# Altium schematic symbol library jlcpcb_2025_04_inductors_extended_0603.schlib: 1269 symbols (part 4 of 7) (continued)
## LQW18ANR13J00D
designator L?  Inductance: 130nH
Inductor, 130nH, ±5%, 1.4Ω, 170mA, SMD 0603; Manufacturer: Murata Electronics; Manufacturer Part Number: LQW18ANR13J00D; Package Size: 0603; JLCPCB Basic Part: No; JLCPCB Part Number: C701178; Supplier 1: LCSC; Category: Inductors; Supplier Part Number 1: C701178; Tolerance: ±5%; Rated Current: 170mA; DC Resistance: 1.4Ω; RoHS: Yes; ComponentLink1Description: Datasheet; ComponentLink1URL: https://wmsc.lcsc.com/wmsc/upload/file/pdf/v2/lcsc/2009291135_Murata-Electronics-LQW18ANR13J00D_C701178.pdf; ComponentLink2Description: JLCPCB Part URL; ComponentLink2URL: https://jlcpcb.com/partdetail/C701178; ComponentLink3Description: LCSC Part URL; ComponentLink3URL: https://lcsc.com/product-detail/Power-Inductors_Murata-Electronics-Murata-Electronics-LQW18ANR13J00D_C701178.html
footprint IND-0603 (0603 (1608M) Inductor)
pins: 1, 2

## LQW18ANR15G00D
designator L?  Inductance: 150nH
Inductor, 150nH, ±2%, 1.5Ω, SMD 0603; Manufacturer: Murata Electronics; Manufacturer Part Number: LQW18ANR15G00D; Self-Resonant Frequency: 1.4GHz; Q Factor: 32@150MHz; Package Size: 0603; JLCPCB Basic Part: No; JLCPCB Part Number: C113131; Supplier 1: LCSC; Category: Inductors; Supplier Part Number 1: C113131; Tolerance: ±2%; DC Resistance: 1.5Ω; RoHS: Yes; ComponentLink1Description: Datasheet; ComponentLink1URL: https://wmsc.lcsc.com/wmsc/upload/file/pdf/v2/lcsc/2304140030_Murata-Electronics-LQW18ANR15G00D_C113131.pdf; ComponentLink2Description: JLCPCB Part URL; ComponentLink2URL: https://jlcpcb.com/partdetail/C113131; ComponentLink3Description: LCSC Part URL; ComponentLink3URL: https://lcsc.com/product-detail/Inductors-SMD_Murata-Electronics-Murata-Electronics-LQW18ANR15G00D_C113131.html
footprint IND-0603 (0603 (1608M) Inductor)
pins: 1, 2

## LQW18ANR15G80D
designator L?  Inductance: 150nH
Inductor, 150nH, ±2%, 870mΩ, SMD 0603; Manufacturer: Murata Electronics; Manufacturer Part Number: LQW18ANR15G80D; Self-Resonant Frequency: 1.58GHz; Q Factor: 28@150MHz; Package Size: 0603; JLCPCB Basic Part: No; JLCPCB Part Number: C307614; Supplier 1: LCSC; Category: Inductors; Supplier Part Number 1: C307614; Tolerance: ±2%; DC Resistance: 870mΩ; RoHS: Yes; ComponentLink1Description: Datasheet; ComponentLink1URL: https://wmsc.lcsc.com/wmsc/upload/file/pdf/v2/lcsc/2304140030_Murata-Electronics-LQW18ANR15G80D_C307614.pdf; ComponentLink2Description: JLCPCB Part URL; ComponentLink2URL: https://jlcpcb.com/partdetail/C307614; ComponentLink3Description: LCSC Part URL; ComponentLink3URL: https://lcsc.com/product-detail/Inductors-SMD_Murata-Electronics-Murata-Electronics-LQW18ANR15G80D_C307614.html
footprint IND-0603 (0603 (1608M) Inductor)
pins: 1, 2

## LQW18ANR15J00D
designator L?  Inductance: 150nH
Inductor, 150nH, ±5%, 1.5Ω, 160mA, SMD 0603; Manufacturer: Murata Electronics; Manufacturer Part Number: LQW18ANR15J00D; Self-Resonant Frequency: 1.4GHz; Q Factor: 32@150MHz; Package Size: 0603; JLCPCB Basic Part: No; JLCPCB Part Number: C98090; Supplier 1: LCSC; Category: Inductors; Supplier Part Number 1: C98090; Tolerance: ±5%; Rated Current: 160mA; DC Resistance: 1.5Ω; RoHS: Yes; ComponentLink1Description: Datasheet; ComponentLink1URL: https://wmsc.lcsc.com/wmsc/upload/file/pdf/v2/lcsc/2304140030_Murata-Electronics-LQW18ANR15J00D_C98090.pdf; ComponentLink2Description: JLCPCB Part URL; ComponentLink2URL: https://jlcpcb.com/partdetail/C98090; ComponentLink3Description: LCSC Part URL; ComponentLink3URL: https://lcsc.com/product-detail/Inductors-SMD_Murata-Electronics-Murata-Electronics-LQW18ANR15J00D_C98090.html
footprint IND-0603 (0603 (1608M) Inductor)
pins: 1, 2

## LQW18ANR15J80D
designator L?  Inductance: 150nH
Inductor, 150nH, ±5%, 870mΩ, 420mA, SMD 0603; Manufacturer: Murata Electronics; Manufacturer Part Number: LQW18ANR15J80D; Package Size: 0603; JLCPCB Basic Part: No; JLCPCB Part Number: C2896795; Supplier 1: LCSC; Category: Inductors; Supplier Part Number 1: C2896795; Tolerance: ±5%; Rated Current: 420mA; DC Resistance: 870mΩ; RoHS: Yes; ComponentLink1Description: Datasheet; ComponentLink1URL: https://wmsc.lcsc.com/wmsc/upload/file/pdf/v2/lcsc/2109180930_Murata-Electronics-LQW18ANR15J80D_C2896795.pdf; ComponentLink2Description: JLCPCB Part URL; ComponentLink2URL: https://jlcpcb.com/partdetail/C2896795; ComponentLink3Description: LCSC Part URL; ComponentLink3URL: https://lcsc.com/product-detail/Power-Inductors_Murata-Electronics-Murata-Electronics-LQW18ANR15J80D_C2896795.html
footprint IND-0603 (0603 (1608M) Inductor)
pins: 1, 2

## LQW18ANR16G00D
designator L?  Inductance: 160nH
Inductor, 160nH, ±2%, 2.1Ω, 150mA, SMD 0603; Manufacturer: Murata Electronics; Manufacturer Part Number: LQW18ANR16G00D; Package Size: 0603; JLCPCB Basic Part: No; JLCPCB Part Number: C307615; Supplier 1: LCSC; Category: Inductors; Supplier Part Number 1: C307615; Tolerance: ±2%; Rated Current: 150mA; DC Resistance: 2.1Ω; RoHS: Yes; ComponentLink1Description: Datasheet; ComponentLink1URL: https://wmsc.lcsc.com/wmsc/upload/file/pdf/v2/lcsc/2304140030_Murata-Electronics-LQW18ANR16G00D_C307615.pdf; ComponentLink2Description: JLCPCB Part URL; ComponentLink2URL: https://jlcpcb.com/partdetail/C307615; ComponentLink3Description: LCSC Part URL; ComponentLink3URL: https://lcsc.com/product-detail/Power-Inductors_Murata-Electronics-Murata-Electronics-LQW18ANR16G00D_C307615.html
footprint IND-0603 (0603 (1608M) Inductor)
pins: 1, 2

## LQW18ANR16J00D
designator L?  Inductance: 160nH
Inductor, 160nH, ±5%, 2.1Ω, 150mA, SMD 0603; Manufacturer: Murata Electronics; Manufacturer Part Number: LQW18ANR16J00D; Self-Resonant Frequency: 1.35GHz; Q Factor: 32@150MHz; Package Size: 0603; JLCPCB Basic Part: No; JLCPCB Part Number: C140445; Supplier 1: LCSC; Category: Inductors; Supplier Part Number 1: C140445; Tolerance: ±5%; Rated Current: 150mA; DC Resistance: 2.1Ω; RoHS: Yes; ComponentLink1Description: Datasheet; ComponentLink1URL: https://wmsc.lcsc.com/wmsc/upload/file/pdf/v2/lcsc/2304140030_Murata-Electronics-LQW18ANR16J00D_C140445.pdf; ComponentLink2Description: JLCPCB Part URL; ComponentLink2URL: https://jlcpcb.com/partdetail/C140445; ComponentLink3Description: LCSC Part URL; ComponentLink3URL: https://lcsc.com/product-detail/Inductors-SMD_Murata-Electronics-Murata-Electronics-LQW18ANR16J00D_C140445.html
footprint IND-0603 (0603 (1608M) Inductor)
pins: 1, 2

## LQW18ANR18G00D
designator L?  Inductance: 180nH
Inductor, 180nH, ±2%, 2.2Ω, 140mA, SMD 0603; Manufacturer: Murata Electronics; Manufacturer Part Number: LQW18ANR18G00D; Self-Resonant Frequency: 1.3GHz; Q Factor: 25@100MHz; Package Size: 0603; JLCPCB Basic Part: No; JLCPCB Part Number: C98091; Supplier 1: LCSC; Category: Inductors; Supplier Part Number 1: C98091; Tolerance: ±2%; Rated Current: 140mA; DC Resistance: 2.2Ω; RoHS: Yes; ComponentLink1Description: Datasheet; ComponentLink1URL: https://wmsc.lcsc.com/wmsc/upload/file/pdf/v2/lcsc/2304140030_Murata-Electronics-LQW18ANR18G00D_C98091.pdf; ComponentLink2Description: JLCPCB Part URL; ComponentLink2URL: https://jlcpcb.com/partdetail/C98091; ComponentLink3Description: LCSC Part URL; ComponentLink3URL: https://lcsc.com/product-detail/Inductors-SMD_Murata-Electronics-Murata-Electronics-LQW18ANR18G00D_C98091.html
footprint IND-0603 (0603 (1608M) Inductor)
pins: 1, 2

## LQW18ANR18G8ZD
designator L?  Inductance: 180nH
Inductor, 180nH, ±2%, 1.65Ω, 310mA, SMD 0603; Manufacturer: Murata Electronics; Manufacturer Part Number: LQW18ANR18G8ZD; Self-Resonant Frequency: 1.38GHz; Q Factor: 25@100MHz; Package Size: 0603; JLCPCB Basic Part: No; JLCPCB Part Number: C1329823; Supplier 1: LCSC; Category: Inductors; Supplier Part Number 1: C1329823; Tolerance: ±2%; Rated Current: 310mA; DC Resistance: 1.65Ω; RoHS: Yes; ComponentLink1Description: Datasheet; ComponentLink1URL: https://wmsc.lcsc.com/wmsc/upload/file/pdf/v2/lcsc/2304140030_Murata-Electronics-LQW18ANR18G8ZD_C1329823.pdf; ComponentLink2Description: JLCPCB Part URL; ComponentLink2URL: https://jlcpcb.com/partdetail/C1329823; ComponentLink3Description: LCSC Part URL; ComponentLink3URL: https://lcsc.com/product-detail/Inductors-SMD_Murata-Electronics-Murata-Electronics-LQW18ANR18G8ZD_C1329823.html
footprint IND-0603 (0603 (1608M) Inductor)
pins: 1, 2

## LQW18ANR18G80D
designator L?  Inductance: 180nH
Inductor, 180nH, ±2%, 1.65Ω, SMD 0603; Manufacturer: Murata Electronics; Manufacturer Part Number: LQW18ANR18G80D; Self-Resonant Frequency: 1.38GHz; Q Factor: 25@100MHz; Package Size: 0603; JLCPCB Basic Part: No; JLCPCB Part Number: C162650; Supplier 1: LCSC; Category: Inductors; Supplier Part Number 1: C162650; Tolerance: ±2%; DC Resistance: 1.65Ω; RoHS: Yes; ComponentLink1Description: Datasheet; ComponentLink1URL: https://wmsc.lcsc.com/wmsc/upload/file/pdf/v2/lcsc/2304140030_Murata-Electronics-LQW18ANR18G80D_C162650.pdf; ComponentLink2Description: JLCPCB Part URL; ComponentLink2URL: https://jlcpcb.com/partdetail/C162650; ComponentLink3Description: LCSC Part URL; ComponentLink3URL: https://lcsc.com/product-detail/Inductors-SMD_Murata-Electronics-Murata-Electronics-LQW18ANR18G80D_C162650.html
footprint IND-0603 (0603 (1608M) Inductor)
pins: 1, 2

## LQW18ANR18J00D
designator L?  Inductance: 180nH
Inductor, 180nH, ±5%, 2.2Ω, 140mA, SMD 0603; Manufacturer: Murata Electronics; Manufacturer Part Number: LQW18ANR18J00D; Self-Resonant Frequency: 1.3GHz; Q Factor: 25@100MHz; Package Size: 0603; JLCPCB Basic Part: No; JLCPCB Part Number: C77126; Supplier 1: LCSC; Category: Inductors; Supplier Part Number 1: C77126; Tolerance: ±5%; Rated Current: 140mA; DC Resistance: 2.2Ω; RoHS: Yes; ComponentLink1Description: Datasheet; ComponentLink1URL: https://wmsc.lcsc.com/wmsc/upload/file/pdf/v2/lcsc/2304140030_Murata-Electronics-LQW18ANR18J00D_C77126.pdf; ComponentLink2Description: JLCPCB Part URL; ComponentLink2URL: https://jlcpcb.com/partdetail/C77126; ComponentLink3Description: LCSC Part URL; ComponentLink3URL: https://lcsc.com/product-detail/Inductors-SMD_Murata-Electronics-Murata-Electronics-LQW18ANR18J00D_C77126.html
footprint IND-0603 (0603 (1608M) Inductor)
pins: 1, 2

## LQW18ANR18J0ZD
designator L?  Inductance: 180nH
Inductor, 180nH, ±5%, 2.2Ω, 140mA, SMD 0603; Manufacturer: Murata Electronics; Manufacturer Part Number: LQW18ANR18J0ZD; Package Size: 0603; JLCPCB Basic Part: No; JLCPCB Part Number: C668475; Supplier 1: LCSC; Category: Inductors; Supplier Part Number 1: C668475; Tolerance: ±5%; Rated Current: 140mA; DC Resistance: 2.2Ω; RoHS: Yes; ComponentLink1Description: Datasheet; ComponentLink1URL: https://wmsc.lcsc.com/wmsc/upload/file/pdf/v2/lcsc/2212301209_Murata-Electronics-LQW18ANR18J0ZD_C668475.pdf; ComponentLink2Description: JLCPCB Part URL; ComponentLink2URL: https://jlcpcb.com/partdetail/C668475; ComponentLink3Description: LCSC Part URL; ComponentLink3URL: https://lcsc.com/product-detail/Power-Inductors_Murata-Electronics-Murata-Electronics-LQW18ANR18J0ZD_C668475.html
footprint IND-0603 (0603 (1608M) Inductor)
pins: 1, 2

## LQW18ANR20G00D
designator L?  Inductance: 200nH
Inductor, 200nH, ±2%, 2.4Ω, 120mA, SMD 0603; Manufacturer: Murata Electronics; Manufacturer Part Number: LQW18ANR20G00D; Package Size: 0603; JLCPCB Basic Part: No; JLCPCB Part Number: C307616; Supplier 1: LCSC; Category: Inductors; Supplier Part Number 1: C307616; Tolerance: ±2%; Rated Current: 120mA; DC Resistance: 2.4Ω; RoHS: Yes; ComponentLink1Description: Datasheet; ComponentLink1URL: https://wmsc.lcsc.com/wmsc/upload/file/pdf/v2/lcsc/2308111514_Murata-Electronics-LQW18ANR20G00D_C307616.pdf; ComponentLink2Description: JLCPCB Part URL; ComponentLink2URL: https://jlcpcb.com/partdetail/C307616; ComponentLink3Description: LCSC Part URL; ComponentLink3URL: https://lcsc.com/product-detail/Power-Inductors_Murata-Electronics-Murata-Electronics-LQW18ANR20G00D_C307616.html
footprint IND-0603 (0603 (1608M) Inductor)
pins: 1, 2

## LQW18ANR20J00D
designator L?  Inductance: 200nH
Inductor, 200nH, ±5%, 2.4Ω, 120mA, SMD 0603; Manufacturer: Murata Electronics; Manufacturer Part Number: LQW18ANR20J00D; Package Size: 0603; JLCPCB Basic Part: No; JLCPCB Part Number: C701177; Supplier 1: LCSC; Category: Inductors; Supplier Part Number 1: C701177; Tolerance: ±5%; Rated Current: 120mA; DC Resistance: 2.4Ω; RoHS: Yes; ComponentLink1Description: Datasheet; ComponentLink1URL: https://wmsc.lcsc.com/wmsc/upload/file/pdf/v2/lcsc/2009291135_Murata-Electronics-LQW18ANR20J00D_C701177.pdf; ComponentLink2Description: JLCPCB Part URL; ComponentLink2URL: https://jlcpcb.com/partdetail/C701177; ComponentLink3Description: LCSC Part URL; ComponentLink3URL: https://lcsc.com/product-detail/Power-Inductors_Murata-Electronics-Murata-Electronics-LQW18ANR20J00D_C701177.html
footprint IND-0603 (0603 (1608M) Inductor)
pins: 1, 2

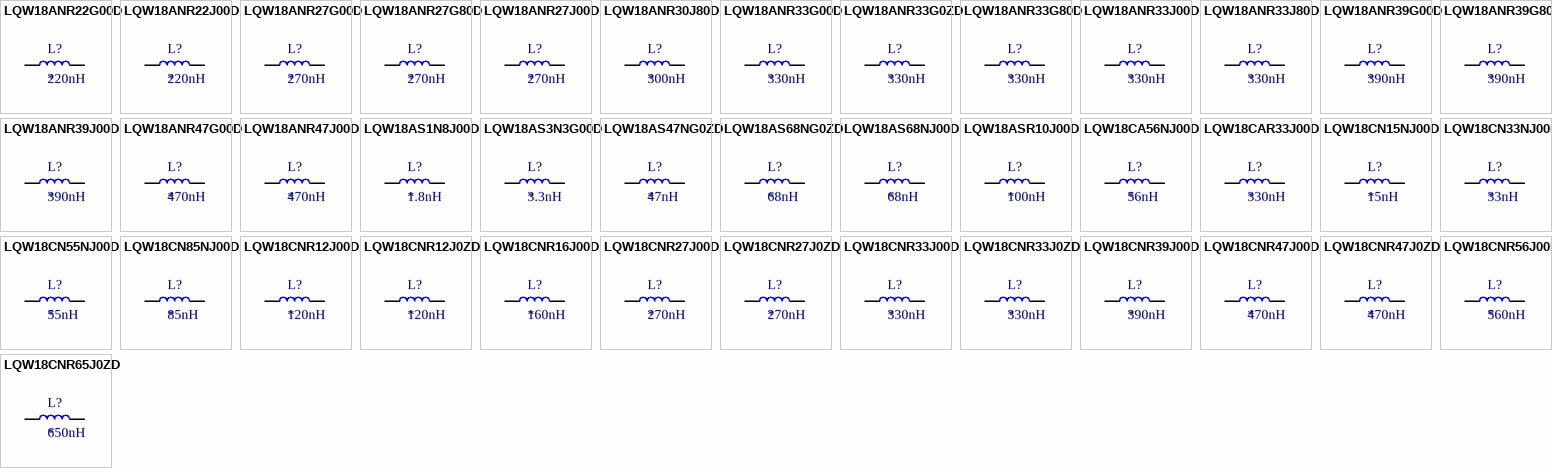
[diagram p17: symbols LQW18ANR22G00D to LQW18CNR65J0ZD]

## LQW18ANR22G00D
designator L?  Inductance: 220nH
Inductor, 220nH, ±2%, 2.5Ω, SMD 0603; Manufacturer: Murata Electronics; Manufacturer Part Number: LQW18ANR22G00D; Self-Resonant Frequency: 1.2GHz; Q Factor: 25@100MHz; Package Size: 0603; JLCPCB Basic Part: No; JLCPCB Part Number: C86139; Supplier 1: LCSC; Category: Inductors; Supplier Part Number 1: C86139; Tolerance: ±2%; DC Resistance: 2.5Ω; RoHS: Yes; ComponentLink1Description: Datasheet; ComponentLink1URL: https://wmsc.lcsc.com/wmsc/upload/file/pdf/v2/lcsc/1811131821_Murata-Electronics-LQW18ANR22G00D_C86139.pdf; ComponentLink2Description: JLCPCB Part URL; ComponentLink2URL: https://jlcpcb.com/partdetail/C86139; ComponentLink3Description: LCSC Part URL; ComponentLink3URL: https://lcsc.com/product-detail/Inductors-SMD_Murata-Electronics-Murata-Electronics-LQW18ANR22G00D_C86139.html
footprint IND-0603 (0603 (1608M) Inductor)
pins: 1, 2

## LQW18ANR22J00D
designator L?  Inductance: 220nH
Inductor, 220nH, ±5%, 2.5Ω, 120mA, SMD 0603; Manufacturer: Murata Electronics; Manufacturer Part Number: LQW18ANR22J00D; Self-Resonant Frequency: 1.2GHz; Q Factor: 25@100MHz; Package Size: 0603; JLCPCB Basic Part: No; JLCPCB Part Number: C77127; Supplier 1: LCSC; Category: Inductors; Supplier Part Number 1: C77127; Tolerance: ±5%; Rated Current: 120mA; DC Resistance: 2.5Ω; RoHS: Yes; ComponentLink1Description: Datasheet; ComponentLink1URL: https://wmsc.lcsc.com/wmsc/upload/file/pdf/v2/lcsc/2304140030_Murata-Electronics-LQW18ANR22J00D_C77127.pdf; ComponentLink2Description: JLCPCB Part URL; ComponentLink2URL: https://jlcpcb.com/partdetail/C77127; ComponentLink3Description: LCSC Part URL; ComponentLink3URL: https://lcsc.com/product-detail/Inductors-SMD_Murata-Electronics-Murata-Electronics-LQW18ANR22J00D_C77127.html
footprint IND-0603 (0603 (1608M) Inductor)
pins: 1, 2

## LQW18ANR27G00D
designator L?  Inductance: 270nH
Inductor, 270nH, ±2%, 3.4Ω, SMD 0603; Manufacturer: Murata Electronics; Manufacturer Part Number: LQW18ANR27G00D; Self-Resonant Frequency: 960MHz; Q Factor: 30@100MHz; Package Size: 0603; JLCPCB Basic Part: No; JLCPCB Part Number: C98092; Supplier 1: LCSC; Category: Inductors; Supplier Part Number 1: C98092; Tolerance: ±2%; DC Resistance: 3.4Ω; RoHS: Yes; ComponentLink1Description: Datasheet; ComponentLink1URL: https://wmsc.lcsc.com/wmsc/upload/file/pdf/v2/lcsc/2304140030_Murata-Electronics-LQW18ANR27G00D_C98092.pdf; ComponentLink2Description: JLCPCB Part URL; ComponentLink2URL: https://jlcpcb.com/partdetail/C98092; ComponentLink3Description: LCSC Part URL; ComponentLink3URL: https://lcsc.com/product-detail/Inductors-SMD_Murata-Electronics-Murata-Electronics-LQW18ANR27G00D_C98092.html
footprint IND-0603 (0603 (1608M) Inductor)
pins: 1, 2

## LQW18ANR27G80D
designator L?  Inductance: 270nH
Inductor, 270nH, ±2%, 2.42Ω, SMD 0603; Manufacturer: Murata Electronics; Manufacturer Part Number: LQW18ANR27G80D; Self-Resonant Frequency: 1.25GHz; Q Factor: 24@100MHz; Package Size: 0603; JLCPCB Basic Part: No; JLCPCB Part Number: C668477; Supplier 1: LCSC; Category: Inductors; Supplier Part Number 1: C668477; Tolerance: ±2%; DC Resistance: 2.42Ω; RoHS: Yes; ComponentLink1Description: Datasheet; ComponentLink1URL: https://wmsc.lcsc.com/wmsc/upload/file/pdf/v2/lcsc/2105241313_Murata-Electronics-LQW18ANR27G80D_C668477.pdf; ComponentLink2Description: JLCPCB Part URL; ComponentLink2URL: https://jlcpcb.com/partdetail/C668477; ComponentLink3Description: LCSC Part URL; ComponentLink3URL: https://lcsc.com/product-detail/Inductors-SMD_Murata-Electronics-Murata-Electronics-LQW18ANR27G80D_C668477.html
footprint IND-0603 (0603 (1608M) Inductor)
pins: 1, 2

## LQW18ANR27J00D
designator L?  Inductance: 270nH
Inductor, 270nH, ±5%, 3.4Ω, SMD 0603; Manufacturer: Murata Electronics; Manufacturer Part Number: LQW18ANR27J00D; Self-Resonant Frequency: 960MHz; Q Factor: 30@100MHz; Package Size: 0603; JLCPCB Basic Part: No; JLCPCB Part Number: C98093; Supplier 1: LCSC; Category: Inductors; Supplier Part Number 1: C98093; Tolerance: ±5%; DC Resistance: 3.4Ω; RoHS: Yes; ComponentLink1Description: Datasheet; ComponentLink1URL: https://wmsc.lcsc.com/wmsc/upload/file/pdf/v2/lcsc/2304140030_Murata-Electronics-LQW18ANR27J00D_C98093.pdf; ComponentLink2Description: JLCPCB Part URL; ComponentLink2URL: https://jlcpcb.com/partdetail/C98093; ComponentLink3Description: LCSC Part URL; ComponentLink3URL: https://lcsc.com/product-detail/Inductors-SMD_Murata-Electronics-Murata-Electronics-LQW18ANR27J00D_C98093.html
footprint IND-0603 (0603 (1608M) Inductor)
pins: 1, 2

## LQW18ANR30J80D
designator L?  Inductance: 300nH
Inductor, 300nH, ±5%, 3.12Ω, 220mA, SMD 0603; Manufacturer: Murata Electronics; Manufacturer Part Number: LQW18ANR30J80D; Self-Resonant Frequency: 1.2GHz; Q Factor: 25@100MHz; Package Size: 0603; JLCPCB Basic Part: No; JLCPCB Part Number: C237433; Supplier 1: LCSC; Category: Inductors; Supplier Part Number 1: C237433; Tolerance: ±5%; Rated Current: 220mA; DC Resistance: 3.12Ω; RoHS: Yes; ComponentLink1Description: Datasheet; ComponentLink1URL: https://wmsc.lcsc.com/wmsc/upload/file/pdf/v2/lcsc/2304140030_Murata-Electronics-LQW18ANR30J80D_C237433.pdf; ComponentLink2Description: JLCPCB Part URL; ComponentLink2URL: https://jlcpcb.com/partdetail/C237433; ComponentLink3Description: LCSC Part URL; ComponentLink3URL: https://lcsc.com/product-detail/Inductors-SMD_Murata-Electronics-Murata-Electronics-LQW18ANR30J80D_C237433.html
footprint IND-0603 (0603 (1608M) Inductor)
pins: 1, 2

## LQW18ANR33G00D
designator L?  Inductance: 330nH
Inductor, 330nH, ±2%, 5.5Ω, SMD 0603; Manufacturer: Murata Electronics; Manufacturer Part Number: LQW18ANR33G00D; Self-Resonant Frequency: 800MHz; Q Factor: 30@100MHz; Package Size: 0603; JLCPCB Basic Part: No; JLCPCB Part Number: C162651; Supplier 1: LCSC; Category: Inductors; Supplier Part Number 1: C162651; Tolerance: ±2%; DC Resistance: 5.5Ω; RoHS: Yes; ComponentLink1Description: Datasheet; ComponentLink1URL: https://wmsc.lcsc.com/wmsc/upload/file/pdf/v2/lcsc/2304140030_Murata-Electronics-LQW18ANR33G00D_C162651.pdf; ComponentLink2Description: JLCPCB Part URL; ComponentLink2URL: https://jlcpcb.com/partdetail/C162651; ComponentLink3Description: LCSC Part URL; ComponentLink3URL: https://lcsc.com/product-detail/Inductors-SMD_Murata-Electronics-Murata-Electronics-LQW18ANR33G00D_C162651.html
footprint IND-0603 (0603 (1608M) Inductor)
pins: 1, 2

## LQW18ANR33G0ZD
designator L?  Inductance: 330nH
Inductor, 330nH, ±2%, 5.5Ω, SMD 0603; Manufacturer: Murata Electronics; Manufacturer Part Number: LQW18ANR33G0ZD; Self-Resonant Frequency: 800MHz; Q Factor: 30@100MHz; Package Size: 0603; JLCPCB Basic Part: No; JLCPCB Part Number: C162652; Supplier 1: LCSC; Category: Inductors; Supplier Part Number 1: C162652; Tolerance: ±2%; DC Resistance: 5.5Ω; RoHS: Yes; ComponentLink1Description: Datasheet; ComponentLink1URL: https://wmsc.lcsc.com/wmsc/upload/file/pdf/v2/lcsc/1810311124_Murata-Electronics-LQW18ANR33G0ZD_C162652.pdf; ComponentLink2Description: JLCPCB Part URL; ComponentLink2URL: https://jlcpcb.com/partdetail/C162652; ComponentLink3Description: LCSC Part URL; ComponentLink3URL: https://lcsc.com/product-detail/Inductors-SMD_Murata-Electronics-Murata-Electronics-LQW18ANR33G0ZD_C162652.html
footprint IND-0603 (0603 (1608M) Inductor)
pins: 1, 2

## LQW18ANR33G80D
designator L?  Inductance: 330nH
Inductor, 330nH, ±2%, 3.84Ω, 190mA, SMD 0603; Manufacturer: Murata Electronics; Manufacturer Part Number: LQW18ANR33G80D; Package Size: 0603; JLCPCB Basic Part: No; JLCPCB Part Number: C440245; Supplier 1: LCSC; Category: Inductors; Supplier Part Number 1: C440245; Tolerance: ±2%; Rated Current: 190mA; DC Resistance: 3.84Ω; RoHS: Yes; ComponentLink1Description: Datasheet; ComponentLink1URL: https://wmsc.lcsc.com/wmsc/upload/file/pdf/v2/lcsc/2304140030_Murata-Electronics-LQW18ANR33G80D_C440245.pdf; ComponentLink2Description: JLCPCB Part URL; ComponentLink2URL: https://jlcpcb.com/partdetail/C440245; ComponentLink3Description: LCSC Part URL; ComponentLink3URL: https://lcsc.com/product-detail/Power-Inductors_Murata-Electronics-Murata-Electronics-LQW18ANR33G80D_C440245.html
footprint IND-0603 (0603 (1608M) Inductor)
pins: 1, 2

## LQW18ANR33J00D
designator L?  Inductance: 330nH
Inductor, 330nH, ±5%, 5.5Ω, SMD 0603; Manufacturer: Murata Electronics; Manufacturer Part Number: LQW18ANR33J00D; Self-Resonant Frequency: 800MHz; Q Factor: 30@100MHz; Package Size: 0603; JLCPCB Basic Part: No; JLCPCB Part Number: C98094; Supplier 1: LCSC; Category: Inductors; Supplier Part Number 1: C98094; Tolerance: ±5%; DC Resistance: 5.5Ω; RoHS: Yes; ComponentLink1Description: Datasheet; ComponentLink1URL: https://wmsc.lcsc.com/wmsc/upload/file/pdf/v2/lcsc/2304140030_Murata-Electronics-LQW18ANR33J00D_C98094.pdf; ComponentLink2Description: JLCPCB Part URL; ComponentLink2URL: https://jlcpcb.com/partdetail/C98094; ComponentLink3Description: LCSC Part URL; ComponentLink3URL: https://lcsc.com/product-detail/Inductors-SMD_Murata-Electronics-Murata-Electronics-LQW18ANR33J00D_C98094.html
footprint IND-0603 (0603 (1608M) Inductor)
pins: 1, 2

## LQW18ANR33J80D
designator L?  Inductance: 330nH
Inductor, 330nH, ±5%, 3.84Ω, 190mA, SMD 0603; Manufacturer: Murata Electronics; Manufacturer Part Number: LQW18ANR33J80D; Self-Resonant Frequency: 1.1GHz; Q Factor: 25@100MHz; Package Size: 0603; JLCPCB Basic Part: No; JLCPCB Part Number: C162653; Supplier 1: LCSC; Category: Inductors; Supplier Part Number 1: C162653; Tolerance: ±5%; Rated Current: 190mA; DC Resistance: 3.84Ω; RoHS: Yes; ComponentLink1Description: Datasheet; ComponentLink1URL: https://wmsc.lcsc.com/wmsc/upload/file/pdf/v2/lcsc/2304140030_Murata-Electronics-LQW18ANR33J80D_C162653.pdf; ComponentLink2Description: JLCPCB Part URL; ComponentLink2URL: https://jlcpcb.com/partdetail/C162653; ComponentLink3Description: LCSC Part URL; ComponentLink3URL: https://lcsc.com/product-detail/Inductors-SMD_Murata-Electronics-Murata-Electronics-LQW18ANR33J80D_C162653.html
footprint IND-0603 (0603 (1608M) Inductor)
pins: 1, 2

## LQW18ANR39G00D
designator L?  Inductance: 390nH
Inductor, 390nH, ±2%, 6.2Ω, 80mA, SMD 0603; Manufacturer: Murata Electronics; Manufacturer Part Number: LQW18ANR39G00D; Self-Resonant Frequency: 800MHz; Q Factor: 30@100MHz; Package Size: 0603; JLCPCB Basic Part: No; JLCPCB Part Number: C98095; Supplier 1: LCSC; Category: Inductors; Supplier Part Number 1: C98095; Tolerance: ±2%; Rated Current: 80mA; DC Resistance: 6.2Ω; RoHS: Yes; ComponentLink1Description: Datasheet; ComponentLink1URL: https://wmsc.lcsc.com/wmsc/upload/file/pdf/v2/lcsc/2304140030_Murata-Electronics-LQW18ANR39G00D_C98095.pdf; ComponentLink2Description: JLCPCB Part URL; ComponentLink2URL: https://jlcpcb.com/partdetail/C98095; ComponentLink3Description: LCSC Part URL; ComponentLink3URL: https://lcsc.com/product-detail/Inductors-SMD_Murata-Electronics-Murata-Electronics-LQW18ANR39G00D_C98095.html
footprint IND-0603 (0603 (1608M) Inductor)
pins: 1, 2

## LQW18ANR39G80D
designator L?  Inductance: 390nH
Inductor, 390nH, ±2%, 4.23Ω, 190mA, SMD 0603; Manufacturer: Murata Electronics; Manufacturer Part Number: LQW18ANR39G80D; Self-Resonant Frequency: 1.1GHz; Q Factor: 25@100MHz; Package Size: 0603; JLCPCB Basic Part: No; JLCPCB Part Number: C2048862; Supplier 1: LCSC; Category: Inductors; Supplier Part Number 1: C2048862; Tolerance: ±2%; Rated Current: 190mA; DC Resistance: 4.23Ω; RoHS: Yes; ComponentLink1Description: Datasheet; ComponentLink1URL: https://wmsc.lcsc.com/wmsc/upload/file/pdf/v2/lcsc/2304140030_Murata-Electronics-LQW18ANR39G80D_C2048862.pdf; ComponentLink2Description: JLCPCB Part URL; ComponentLink2URL: https://jlcpcb.com/partdetail/C2048862; ComponentLink3Description: LCSC Part URL; ComponentLink3URL: https://lcsc.com/product-detail/Inductors-SMD_Murata-Electronics-Murata-Electronics-LQW18ANR39G80D_C2048862.html
footprint IND-0603 (0603 (1608M) Inductor)
pins: 1, 2

## LQW18ANR39J00D
designator L?  Inductance: 390nH
Inductor, 390nH, ±5%, 6.2Ω, SMD 0603; Manufacturer: Murata Electronics; Manufacturer Part Number: LQW18ANR39J00D; Self-Resonant Frequency: 800MHz; Q Factor: 30@100MHz; Package Size: 0603; JLCPCB Basic Part: No; JLCPCB Part Number: C98096; Supplier 1: LCSC; Category: Inductors; Supplier Part Number 1: C98096; Tolerance: ±5%; DC Resistance: 6.2Ω; RoHS: Yes; ComponentLink1Description: Datasheet; ComponentLink1URL: https://wmsc.lcsc.com/wmsc/upload/file/pdf/v2/lcsc/2304140030_Murata-Electronics-LQW18ANR39J00D_C98096.pdf; ComponentLink2Description: JLCPCB Part URL; ComponentLink2URL: https://jlcpcb.com/partdetail/C98096; ComponentLink3Description: LCSC Part URL; ComponentLink3URL: https://lcsc.com/product-detail/Inductors-SMD_Murata-Electronics-Murata-Electronics-LQW18ANR39J00D_C98096.html
footprint IND-0603 (0603 (1608M) Inductor)
pins: 1, 2

## LQW18ANR47G00D
designator L?  Inductance: 470nH
Inductor, 470nH, ±2%, 7Ω, 75mA, SMD 0603; Manufacturer: Murata Electronics; Manufacturer Part Number: LQW18ANR47G00D; Self-Resonant Frequency: 700MHz; Q Factor: 30@100MHz; Package Size: 0603; JLCPCB Basic Part: No; JLCPCB Part Number: C113132; Supplier 1: LCSC; Category: Inductors; Supplier Part Number 1: C113132; Tolerance: ±2%; Rated Current: 75mA; DC Resistance: 7Ω; RoHS: Yes; ComponentLink1Description: Datasheet; ComponentLink1URL: https://wmsc.lcsc.com/wmsc/upload/file/pdf/v2/lcsc/2304140030_Murata-Electronics-LQW18ANR47G00D_C113132.pdf; ComponentLink2Description: JLCPCB Part URL; ComponentLink2URL: https://jlcpcb.com/partdetail/C113132; ComponentLink3Description: LCSC Part URL; ComponentLink3URL: https://lcsc.com/product-detail/Inductors-SMD_Murata-Electronics-Murata-Electronics-LQW18ANR47G00D_C113132.html
footprint IND-0603 (0603 (1608M) Inductor)
pins: 1, 2

## LQW18ANR47J00D
designator L?  Inductance: 470nH
Inductor, 470nH, ±5%, 7Ω, 75mA, SMD 0603; Manufacturer: Murata Electronics; Manufacturer Part Number: LQW18ANR47J00D; Self-Resonant Frequency: 700MHz; Q Factor: 30@100MHz; Package Size: 0603; JLCPCB Basic Part: No; JLCPCB Part Number: C98097; Supplier 1: LCSC; Category: Inductors; Supplier Part Number 1: C98097; Tolerance: ±5%; Rated Current: 75mA; DC Resistance: 7Ω; RoHS: Yes; ComponentLink1Description: Datasheet; ComponentLink1URL: https://wmsc.lcsc.com/wmsc/upload/file/pdf/v2/lcsc/2304140030_Murata-Electronics-LQW18ANR47J00D_C98097.pdf; ComponentLink2Description: JLCPCB Part URL; ComponentLink2URL: https://jlcpcb.com/partdetail/C98097; ComponentLink3Description: LCSC Part URL; ComponentLink3URL: https://lcsc.com/product-detail/Inductors-SMD_Murata-Electronics-Murata-Electronics-LQW18ANR47J00D_C98097.html
footprint IND-0603 (0603 (1608M) Inductor)
pins: 1, 2

## LQW18AS1N8J00D
designator L?  Inductance: 1.8nH
Inductor, 1.8nH, ±5%, 45mΩ, 700mA, SMD 0603; Manufacturer: Murata Electronics; Manufacturer Part Number: LQW18AS1N8J00D; Package Size: 0603; JLCPCB Basic Part: No; JLCPCB Part Number: C341698; Supplier 1: LCSC; Category: Inductors; Supplier Part Number 1: C341698; Tolerance: ±5%; Rated Current: 700mA; DC Resistance: 45mΩ; RoHS: Yes; ComponentLink1Description: Datasheet; ComponentLink1URL: https://wmsc.lcsc.com/wmsc/upload/file/pdf/v2/lcsc/2304140030_Murata-Electronics-LQW18AS1N8J00D_C341698.pdf; ComponentLink2Description: JLCPCB Part URL; ComponentLink2URL: https://jlcpcb.com/partdetail/C341698; ComponentLink3Description: LCSC Part URL; ComponentLink3URL: https://lcsc.com/product-detail/Inductors-SMD_Murata-Electronics-Murata-Electronics-LQW18AS1N8J00D_C341698.html
footprint IND-0603 (0603 (1608M) Inductor)
pins: 1, 2

## LQW18AS3N3G00D
designator L?  Inductance: 3.3nH
Inductor, 3.3nH, ±2%, 700mA, SMD 0603; Manufacturer: Murata Electronics; Manufacturer Part Number: LQW18AS3N3G00D; Self-Resonant Frequency: 100MHz; Q Factor: 35@250MHz; Package Size: 0603; JLCPCB Basic Part: No; JLCPCB Part Number: C341699; Supplier 1: LCSC; Category: Inductors; Supplier Part Number 1: C341699; Tolerance: ±2%; Rated Current: 700mA; RoHS: Yes; ComponentLink1Description: Datasheet; ComponentLink1URL: https://wmsc.lcsc.com/wmsc/upload/file/pdf/v2/lcsc/1912111437_Murata-Electronics-LQW18AS3N3G00D_C341699.pdf; ComponentLink2Description: JLCPCB Part URL; ComponentLink2URL: https://jlcpcb.com/partdetail/C341699; ComponentLink3Description: LCSC Part URL; ComponentLink3URL: https://lcsc.com/product-detail/Inductors-SMD_Murata-Electronics-Murata-Electronics-LQW18AS3N3G00D_C341699.html
footprint IND-0603 (0603 (1608M) Inductor)
pins: 1, 2

## LQW18AS47NG0ZD
designator L?  Inductance: 47nH
Inductor, 47nH, ±2%, 280mΩ, 600mA, SMD 0603; Manufacturer: Murata Electronics; Manufacturer Part Number: LQW18AS47NG0ZD; Package Size: 0603; JLCPCB Basic Part: No; JLCPCB Part Number: C2044000; Supplier 1: LCSC; Category: Inductors; Supplier Part Number 1: C2044000; Tolerance: ±2%; Rated Current: 600mA; DC Resistance: 280mΩ; RoHS: Yes; ComponentLink1Description: Datasheet; ComponentLink1URL: https://wmsc.lcsc.com/wmsc/upload/file/pdf/v2/lcsc/2304140030_Murata-Electronics-LQW18AS47NG0ZD_C2044000.pdf; ComponentLink2Description: JLCPCB Part URL; ComponentLink2URL: https://jlcpcb.com/partdetail/C2044000; ComponentLink3Description: LCSC Part URL; ComponentLink3URL: https://lcsc.com/product-detail/Power-Inductors_Murata-Electronics-Murata-Electronics-LQW18AS47NG0ZD_C2044000.html
footprint IND-0603 (0603 (1608M) Inductor)
pins: 1, 2

## LQW18AS68NG0ZD
designator L?  Inductance: 68nH
Inductor, 68nH, ±2%, 340mΩ, 600mA, SMD 0603; Manufacturer: Murata Electronics; Manufacturer Part Number: LQW18AS68NG0ZD; Self-Resonant Frequency: 1.7GHz; Q Factor: 37@200MHz; Package Size: 0603; JLCPCB Basic Part: No; JLCPCB Part Number: C1330542; Supplier 1: LCSC; Category: Inductors; Supplier Part Number 1: C1330542; Tolerance: ±2%; Rated Current: 600mA; DC Resistance: 340mΩ; RoHS: Yes; ComponentLink1Description: Datasheet; ComponentLink1URL: https://wmsc.lcsc.com/wmsc/upload/file/pdf/v2/lcsc/2304140030_Murata-Electronics-LQW18AS68NG0ZD_C1330542.pdf; ComponentLink2Description: JLCPCB Part URL; ComponentLink2URL: https://jlcpcb.com/partdetail/C1330542; ComponentLink3Description: LCSC Part URL; ComponentLink3URL: https://lcsc.com/product-detail/Inductors-SMD_Murata-Electronics-Murata-Electronics-LQW18AS68NG0ZD_C1330542.html
footprint IND-0603 (0603 (1608M) Inductor)
pins: 1, 2

## LQW18AS68NJ00D
designator L?  Inductance: 68nH
Inductor, 68nH, ±5%, 340mΩ, 600mA, SMD 0603; Manufacturer: Murata Electronics; Manufacturer Part Number: LQW18AS68NJ00D; Self-Resonant Frequency: 1.7GHz; Q Factor: 37@200MHz; Package Size: 0603; JLCPCB Basic Part: No; JLCPCB Part Number: C701163; Supplier 1: LCSC; Category: Inductors; Supplier Part Number 1: C701163; Tolerance: ±5%; Rated Current: 600mA; DC Resistance: 340mΩ; RoHS: Yes; ComponentLink1Description: Datasheet; ComponentLink1URL: https://wmsc.lcsc.com/wmsc/upload/file/pdf/v2/lcsc/2009241508_Murata-Electronics-LQW18AS68NJ00D_C701163.pdf; ComponentLink2Description: JLCPCB Part URL; ComponentLink2URL: https://jlcpcb.com/partdetail/C701163; ComponentLink3Description: LCSC Part URL; ComponentLink3URL: https://lcsc.com/product-detail/Inductors-SMD_Murata-Electronics-Murata-Electronics-LQW18AS68NJ00D_C701163.html
footprint IND-0603 (0603 (1608M) Inductor)
pins: 1, 2

## LQW18ASR10J00D
designator L?  Inductance: 100nH
Inductor, 100nH, ±5%, 580mΩ, 400mA, SMD 0603; Manufacturer: Murata Electronics; Manufacturer Part Number: LQW18ASR10J00D; Package Size: 0603; JLCPCB Basic Part: No; JLCPCB Part Number: C162655; Supplier 1: LCSC; Category: Inductors; Supplier Part Number 1: C162655; Tolerance: ±5%; Rated Current: 400mA; DC Resistance: 580mΩ; RoHS: Yes; ComponentLink1Description: Datasheet; ComponentLink1URL: https://wmsc.lcsc.com/wmsc/upload/file/pdf/v2/lcsc/2304140030_Murata-Electronics-LQW18ASR10J00D_C162655.pdf; ComponentLink2Description: JLCPCB Part URL; ComponentLink2URL: https://jlcpcb.com/partdetail/C162655; ComponentLink3Description: LCSC Part URL; ComponentLink3URL: https://lcsc.com/product-detail/Inductors-SMD_Murata-Electronics-Murata-Electronics-LQW18ASR10J00D_C162655.html
footprint IND-0603 (0603 (1608M) Inductor)
pins: 1, 2

## LQW18CA56NJ00D
designator L?  Inductance: 56nH
Inductor, 56nH, ±5%, 40mΩ, 1.85A, SMD 0603; Manufacturer: Murata Electronics; Manufacturer Part Number: LQW18CA56NJ00D; Package Size: 0603; JLCPCB Basic Part: No; JLCPCB Part Number: C3223622; Supplier 1: LCSC; Category: Inductors; Supplier Part Number 1: C3223622; Tolerance: ±5%; Rated Current: 1.85A; DC Resistance: 40mΩ; RoHS: Yes; ComponentLink1Description: Datasheet; ComponentLink1URL: https://wmsc.lcsc.com/wmsc/upload/file/pdf/v2/lcsc/2308111735_Murata-Electronics-LQW18CA56NJ00D_C3223622.pdf; ComponentLink2Description: JLCPCB Part URL; ComponentLink2URL: https://jlcpcb.com/partdetail/C3223622; ComponentLink3Description: LCSC Part URL; ComponentLink3URL: https://lcsc.com/product-detail/Power-Inductors_Murata-Electronics-Murata-Electronics-LQW18CA56NJ00D_C3223622.html
footprint IND-0603 (0603 (1608M) Inductor)
pins: 1, 2

## LQW18CAR33J00D
designator L?  Inductance: 330nH
Inductor, 330nH, ±5%, 200mΩ, 780mA, SMD 0603; Manufacturer: Murata Electronics; Manufacturer Part Number: LQW18CAR33J00D; Self-Resonant Frequency: 970MHz; Package Size: 0603; JLCPCB Basic Part: No; JLCPCB Part Number: C1330902; Supplier 1: LCSC; Category: Inductors; Supplier Part Number 1: C1330902; Tolerance: ±5%; Rated Current: 780mA; DC Resistance: 200mΩ; RoHS: Yes; ComponentLink1Description: Datasheet; ComponentLink1URL: https://wmsc.lcsc.com/wmsc/upload/file/pdf/v2/lcsc/2304140030_Murata-Electronics-LQW18CAR33J00D_C1330902.pdf; ComponentLink2Description: JLCPCB Part URL; ComponentLink2URL: https://jlcpcb.com/partdetail/C1330902; ComponentLink3Description: LCSC Part URL; ComponentLink3URL: https://lcsc.com/product-detail/Inductors-SMD_Murata-Electronics-Murata-Electronics-LQW18CAR33J00D_C1330902.html
footprint IND-0603 (0603 (1608M) Inductor)
pins: 1, 2

## LQW18CN15NJ00D
designator L?  Inductance: 15nH
Inductor, 15nH, ±5%, 25mΩ, 2.2A, SMD 0603; Manufacturer: Murata Electronics; Manufacturer Part Number: LQW18CN15NJ00D; Package Size: 0603; JLCPCB Basic Part: No; JLCPCB Part Number: C703106; Supplier 1: LCSC; Category: Inductors; Supplier Part Number 1: C703106; Tolerance: ±5%; Rated Current: 2.2A; DC Resistance: 25mΩ; RoHS: Yes; ComponentLink1Description: Datasheet; ComponentLink1URL: https://wmsc.lcsc.com/wmsc/upload/file/pdf/v2/lcsc/2304140030_Murata-Electronics-LQW18CN15NJ00D_C703106.pdf; ComponentLink2Description: JLCPCB Part URL; ComponentLink2URL: https://jlcpcb.com/partdetail/C703106; ComponentLink3Description: LCSC Part URL; ComponentLink3URL: https://lcsc.com/product-detail/Power-Inductors_Murata-Electronics-Murata-Electronics-LQW18CN15NJ00D_C703106.html
footprint IND-0603 (0603 (1608M) Inductor)
pins: 1, 2

## LQW18CN33NJ00D
designator L?  Inductance: 33nH
Inductor, 33nH, ±5%, 35mΩ, 1.7A, SMD 0603; Manufacturer: Murata Electronics; Manufacturer Part Number: LQW18CN33NJ00D; Package Size: 0603; JLCPCB Basic Part: No; JLCPCB Part Number: C2041654; Supplier 1: LCSC; Category: Inductors; Supplier Part Number 1: C2041654; Tolerance: ±5%; Rated Current: 1.7A; DC Resistance: 35mΩ; RoHS: Yes; ComponentLink1Description: Datasheet; ComponentLink1URL: https://wmsc.lcsc.com/wmsc/upload/file/pdf/v2/lcsc/2308111514_Murata-Electronics-LQW18CN33NJ00D_C2041654.pdf; ComponentLink2Description: JLCPCB Part URL; ComponentLink2URL: https://jlcpcb.com/partdetail/C2041654; ComponentLink3Description: LCSC Part URL; ComponentLink3URL: https://lcsc.com/product-detail/Power-Inductors_Murata-Electronics-Murata-Electronics-LQW18CN33NJ00D_C2041654.html
footprint IND-0603 (0603 (1608M) Inductor)
pins: 1, 2

## LQW18CN55NJ00D
designator L?  Inductance: 55nH
Inductor, 55nH, ±5%, 450mΩ, 1.5A, SMD 0603; Manufacturer: Murata Electronics; Manufacturer Part Number: LQW18CN55NJ00D; Self-Resonant Frequency: 1.6GHz; Package Size: 0603; JLCPCB Basic Part: No; JLCPCB Part Number: C603111; Supplier 1: LCSC; Category: Inductors; Supplier Part Number 1: C603111; Tolerance: ±5%; Rated Current: 1.5A; DC Resistance: 450mΩ; RoHS: Yes; ComponentLink1Description: Datasheet; ComponentLink1URL: https://wmsc.lcsc.com/wmsc/upload/file/pdf/v2/lcsc/2304140030_Murata-Electronics-LQW18CN55NJ00D_C603111.pdf; ComponentLink2Description: JLCPCB Part URL; ComponentLink2URL: https://jlcpcb.com/partdetail/C603111; ComponentLink3Description: LCSC Part URL; ComponentLink3URL: https://lcsc.com/product-detail/Inductors-SMD_Murata-Electronics-Murata-Electronics-LQW18CN55NJ00D_C603111.html
footprint IND-0603 (0603 (1608M) Inductor)
pins: 1, 2

## LQW18CN85NJ00D
designator L?  Inductance: 85nH
Inductor, 85nH, ±5%, 60mΩ, 1.4A, SMD 0603; Manufacturer: Murata Electronics; Manufacturer Part Number: LQW18CN85NJ00D; Self-Resonant Frequency: 10MHz; Package Size: 0603; JLCPCB Basic Part: No; JLCPCB Part Number: C91628; Supplier 1: LCSC; Category: Inductors; Supplier Part Number 1: C91628; Tolerance: ±5%; Rated Current: 1.4A; DC Resistance: 60mΩ; RoHS: Yes; ComponentLink1Description: Datasheet; ComponentLink1URL: https://wmsc.lcsc.com/wmsc/upload/file/pdf/v2/lcsc/1810311116_Murata-Electronics-LQW18CN85NJ00D_C91628.pdf; ComponentLink2Description: JLCPCB Part URL; ComponentLink2URL: https://jlcpcb.com/partdetail/C91628; ComponentLink3Description: LCSC Part URL; ComponentLink3URL: https://lcsc.com/product-detail/Inductors-SMD_Murata-Electronics-Murata-Electronics-LQW18CN85NJ00D_C91628.html
footprint IND-0603 (0603 (1608M) Inductor)
pins: 1, 2

## LQW18CNR12J00D
designator L?  Inductance: 120nH
Inductor, 120nH, ±5%, 85mΩ, 1.1A, SMD 0603; Manufacturer: Murata Electronics; Manufacturer Part Number: LQW18CNR12J00D; Package Size: 0603; JLCPCB Basic Part: No; JLCPCB Part Number: C269835; Supplier 1: LCSC; Category: Inductors; Supplier Part Number 1: C269835; Tolerance: ±5%; Rated Current: 1.1A; DC Resistance: 85mΩ; RoHS: Yes; ComponentLink1Description: Datasheet; ComponentLink1URL: https://wmsc.lcsc.com/wmsc/upload/file/pdf/v2/lcsc/2304140030_Murata-Electronics-LQW18CNR12J00D_C269835.pdf; ComponentLink2Description: JLCPCB Part URL; ComponentLink2URL: https://jlcpcb.com/partdetail/C269835; ComponentLink3Description: LCSC Part URL; ComponentLink3URL: https://lcsc.com/product-detail/Power-Inductors_Murata-Electronics-Murata-Electronics-LQW18CNR12J00D_C269835.html
footprint IND-0603 (0603 (1608M) Inductor)
pins: 1, 2

## LQW18CNR12J0ZD
designator L?  Inductance: 120nH
Inductor, 120nH, ±5%, 85mΩ, 1.1A, SMD 0603; Manufacturer: Murata Electronics; Manufacturer Part Number: LQW18CNR12J0ZD; Package Size: 0603; JLCPCB Basic Part: No; JLCPCB Part Number: C1858007; Supplier 1: LCSC; Category: Inductors; Supplier Part Number 1: C1858007; Tolerance: ±5%; Rated Current: 1.1A; DC Resistance: 85mΩ; RoHS: Yes; ComponentLink1Description: Datasheet; ComponentLink1URL: https://wmsc.lcsc.com/wmsc/upload/file/pdf/v2/lcsc/2304140030_Murata-Electronics-LQW18CNR12J0ZD_C1858007.pdf; ComponentLink2Description: JLCPCB Part URL; ComponentLink2URL: https://jlcpcb.com/partdetail/C1858007; ComponentLink3Description: LCSC Part URL; ComponentLink3URL: https://lcsc.com/product-detail/Power-Inductors_Murata-Electronics-Murata-Electronics-LQW18CNR12J0ZD_C1858007.html
footprint IND-0603 (0603 (1608M) Inductor)
pins: 1, 2

## LQW18CNR16J00D
designator L?  Inductance: 160nH
Inductor, 160nH, ±5%, 100mΩ, 1A, SMD 0603; Manufacturer: Murata Electronics; Manufacturer Part Number: LQW18CNR16J00D; Self-Resonant Frequency: 900MHz; Package Size: 0603; JLCPCB Basic Part: No; JLCPCB Part Number: C437367; Supplier 1: LCSC; Category: Inductors; Supplier Part Number 1: C437367; Tolerance: ±5%; Rated Current: 1A; DC Resistance: 100mΩ; RoHS: Yes; ComponentLink1Description: Datasheet; ComponentLink1URL: https://wmsc.lcsc.com/wmsc/upload/file/pdf/v2/lcsc/2004021732_Murata-Electronics-LQW18CNR16J00D_C437367.pdf; ComponentLink2Description: JLCPCB Part URL; ComponentLink2URL: https://jlcpcb.com/partdetail/C437367; ComponentLink3Description: LCSC Part URL; ComponentLink3URL: https://lcsc.com/product-detail/Inductors-SMD_Murata-Electronics-Murata-Electronics-LQW18CNR16J00D_C437367.html
footprint IND-0603 (0603 (1608M) Inductor)
pins: 1, 2

## LQW18CNR27J00D
designator L?  Inductance: 270nH
Inductor, 270nH, ±5%, 160mΩ, 750mA, SMD 0603; Manufacturer: Murata Electronics; Manufacturer Part Number: LQW18CNR27J00D; Self-Resonant Frequency: 600MHz; Package Size: 0603; JLCPCB Basic Part: No; JLCPCB Part Number: C703105; Supplier 1: LCSC; Category: Inductors; Supplier Part Number 1: C703105; Tolerance: ±5%; Rated Current: 750mA; DC Resistance: 160mΩ; RoHS: Yes; ComponentLink1Description: Datasheet; ComponentLink1URL: https://wmsc.lcsc.com/wmsc/upload/file/pdf/v2/lcsc/2304140030_Murata-Electronics-LQW18CNR27J00D_C703105.pdf; ComponentLink2Description: JLCPCB Part URL; ComponentLink2URL: https://jlcpcb.com/partdetail/C703105; ComponentLink3Description: LCSC Part URL; ComponentLink3URL: https://lcsc.com/product-detail/Inductors-SMD_Murata-Electronics-Murata-Electronics-LQW18CNR27J00D_C703105.html
footprint IND-0603 (0603 (1608M) Inductor)
pins: 1, 2

## LQW18CNR27J0ZD
designator L?  Inductance: 270nH
Inductor, 270nH, ±5%, 160mΩ, 750mA, SMD 0603; Manufacturer: Murata Electronics; Manufacturer Part Number: LQW18CNR27J0ZD; Package Size: 0603; JLCPCB Basic Part: No; JLCPCB Part Number: C883487; Supplier 1: LCSC; Category: Inductors; Supplier Part Number 1: C883487; Tolerance: ±5%; Rated Current: 750mA; DC Resistance: 160mΩ; RoHS: Yes; ComponentLink1Description: Datasheet; ComponentLink1URL: https://wmsc.lcsc.com/wmsc/upload/file/pdf/v2/lcsc/2304140030_Murata-Electronics-LQW18CNR27J0ZD_C883487.pdf; ComponentLink2Description: JLCPCB Part URL; ComponentLink2URL: https://jlcpcb.com/partdetail/C883487; ComponentLink3Description: LCSC Part URL; ComponentLink3URL: https://lcsc.com/product-detail/Power-Inductors_Murata-Electronics-Murata-Electronics-LQW18CNR27J0ZD_C883487.html
footprint IND-0603 (0603 (1608M) Inductor)
pins: 1, 2

## LQW18CNR33J00D
designator L?  Inductance: 330nH
Inductor, 330nH, ±5%, 250mΩ, 630mA, SMD 0603; Manufacturer: Murata Electronics; Manufacturer Part Number: LQW18CNR33J00D; Package Size: 0603; JLCPCB Basic Part: No; JLCPCB Part Number: C91629; Supplier 1: LCSC; Category: Inductors; Supplier Part Number 1: C91629; Tolerance: ±5%; Rated Current: 630mA; DC Resistance: 250mΩ; RoHS: Yes; ComponentLink1Description: Datasheet; ComponentLink1URL: https://wmsc.lcsc.com/wmsc/upload/file/pdf/v2/lcsc/1810311125_Murata-Electronics-LQW18CNR33J00D_C91629.pdf; ComponentLink2Description: JLCPCB Part URL; ComponentLink2URL: https://jlcpcb.com/partdetail/C91629; ComponentLink3Description: LCSC Part URL; ComponentLink3URL: https://lcsc.com/product-detail/Inductors-SMD_Murata-Electronics-Murata-Electronics-LQW18CNR33J00D_C91629.html
footprint IND-0603 (0603 (1608M) Inductor)
pins: 1, 2

## LQW18CNR33J0ZD
designator L?  Inductance: 330nH
Inductor, 330nH, ±5%, 250mΩ, 630mA, SMD 0603; Manufacturer: Murata Electronics; Manufacturer Part Number: LQW18CNR33J0ZD; Self-Resonant Frequency: 600MHz; Package Size: 0603; JLCPCB Basic Part: No; JLCPCB Part Number: C560065; Supplier 1: LCSC; Category: Inductors; Supplier Part Number 1: C560065; Tolerance: ±5%; Rated Current: 630mA; DC Resistance: 250mΩ; RoHS: Yes; ComponentLink1Description: Datasheet; ComponentLink1URL: https://wmsc.lcsc.com/wmsc/upload/file/pdf/v2/lcsc/2007281833_Murata-Electronics-LQW18CNR33J0ZD_C560065.pdf; ComponentLink2Description: JLCPCB Part URL; ComponentLink2URL: https://jlcpcb.com/partdetail/C560065; ComponentLink3Description: LCSC Part URL; ComponentLink3URL: https://lcsc.com/product-detail/Inductors-SMD_Murata-Electronics-Murata-Electronics-LQW18CNR33J0ZD_C560065.html
footprint IND-0603 (0603 (1608M) Inductor)
pins: 1, 2

## LQW18CNR39J00D
designator L?  Inductance: 390nH
Inductor, 390nH, ±5%, 280mΩ, 620mA, SMD 0603; Manufacturer: Murata Electronics; Manufacturer Part Number: LQW18CNR39J00D; Package Size: 0603; JLCPCB Basic Part: No; JLCPCB Part Number: C603115; Supplier 1: LCSC; Category: Inductors; Supplier Part Number 1: C603115; Tolerance: ±5%; Rated Current: 620mA; DC Resistance: 280mΩ; RoHS: Yes; ComponentLink1Description: Datasheet; ComponentLink1URL: https://wmsc.lcsc.com/wmsc/upload/file/pdf/v2/lcsc/2009091507_Murata-Electronics-LQW18CNR39J00D_C603115.pdf; ComponentLink2Description: JLCPCB Part URL; ComponentLink2URL: https://jlcpcb.com/partdetail/C603115; ComponentLink3Description: LCSC Part URL; ComponentLink3URL: https://lcsc.com/product-detail/Power-Inductors_Murata-Electronics-Murata-Electronics-LQW18CNR39J00D_C603115.html
footprint IND-0603 (0603 (1608M) Inductor)
pins: 1, 2
